# Altium footprint library Molex FFC - FPC Connectors (SMT).PcbLib: 638 footprints (part 4 of 40)
Each footprint in its own frame and in the unit in brackets; x right, y up, seen from the top. Pads: shape width x height; smd on the part's side, far side on the other; paste and mask are expansions set on the pad; w line width, h text height; cw(c..) or ccw(c..) is an arc to the next point about the centre after c.
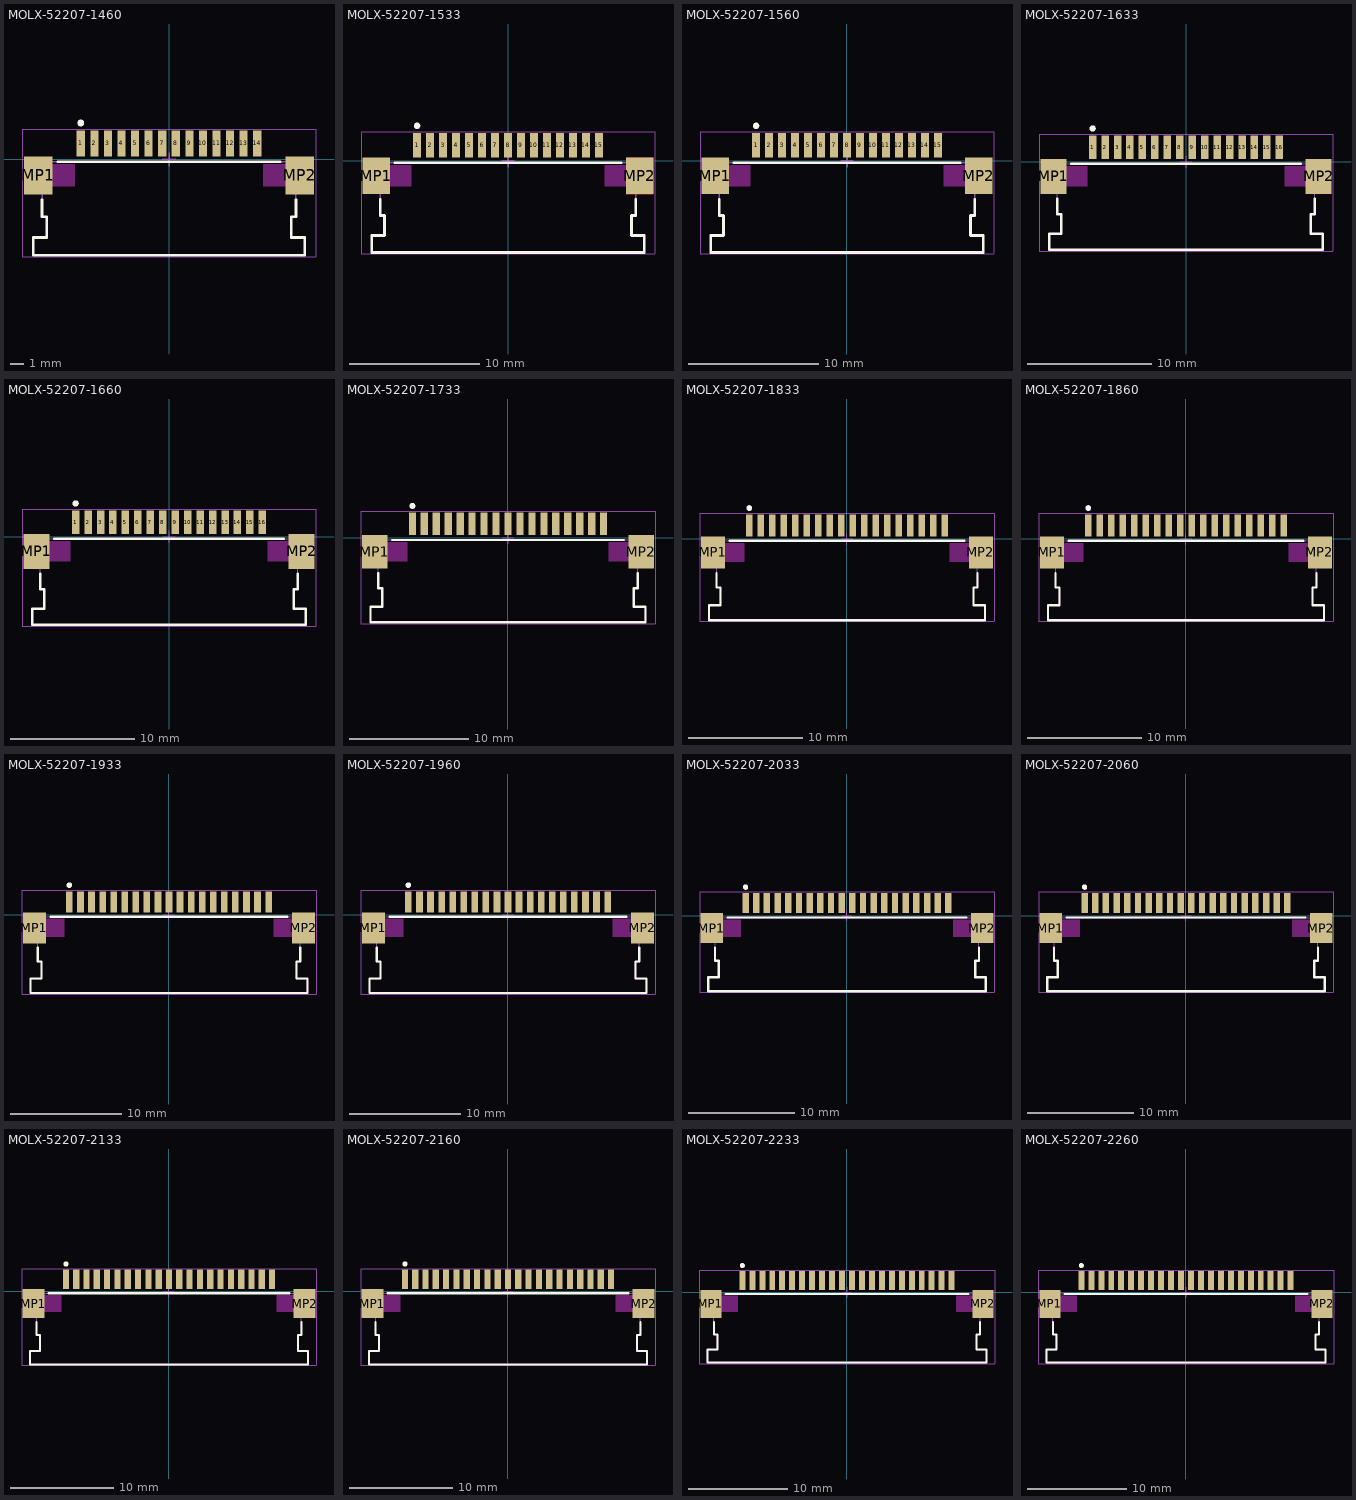
[diagram p3: the footprints below, top view; thin cyan lines are the x and y axes]

## MOLX-52207-1460 [mm] "FPC Connector, 14-Leads, Right Angle, Pitch 1.0 mm, Mated Height 2.7 mm, SMT"
height 2.712
pads (16):
  rect 0.6x1.9 smd: 1(-6.5,1.175) 2(-5.5,1.175) 3(-4.5,1.175) 4(-3.5,1.175) 5(-2.5,1.175) 6(-1.5,1.175) 7(-0.5,1.175) 8(0.5,1.175) 9(1.5,1.175) 10(2.5,1.175) 11(3.5,1.175) 12(4.5,1.175) 13(5.5,1.175) 14(6.5,1.175)
  rect 2.1x2.8 smd: MP1(-9.65,-1.175) MP2(9.65,-1.175)
Top Overlay:
  circle w0.25: c-6.5,2.675 r0.125
  lines w0.2: -9.35,-2.975 -9.35,-4.225 -9.013,-4.225 ; -9.012,-4.225 -9.012,-5.765 -10,-5.765 -10,-7.075 10,-7.075 10,-5.765 9.012,-5.765 9.012,-4.225 ; -8.2,-0.175 8.2,-0.175 ; 9.013,-4.225 9.35,-4.225 9.35,-2.975
Keep-Out Layer:
  region: -8.6,-0.375 -6.95,-0.375 -6.95,-1.975 -8.6,-1.975
  region: 8.6,-0.375 6.95,-0.375 6.95,-1.975 8.6,-1.975
Mechanical 13:
  lines w0.1: -10.15,-2.175 -10.15,-0.175 10.15,-0.175 10.15,-2.175 9.35,-2.175 9.35,-4.225 9.012,-4.225 9.012,-5.765 10,-5.765 10,-7.075 -10,-7.075 -10,-5.765 -9.012,-5.765 -9.012,-4.225 -9.35,-4.225 -9.35,-2.175 -10.15,-2.175
Mechanical 15:
  lines w0.05: -10.8,-7.175 -10.8,2.225 10.8,2.225 10.8,-7.175 -10.8,-7.175
  lines w0.1: -0.5,0 0.5,0 ; 0,-0.5 0,0.5
3D body: height 0.25, standoff 0, extent -10.15,-7.075 10.15,1.825

## MOLX-52207-1533 [mm] "FPC Connector, 15-Leads, Right Angle, Pitch 1.0 mm, Mated Height 2.7 mm, SMT"
height 2.712
pads (17):
  rect 0.6x1.9 smd: 1(-7,1.175) 2(-6,1.175) 3(-5,1.175) 4(-4,1.175) 5(-3,1.175) 6(-2,1.175) 7(-1,1.175) 8(0,1.175) 9(1,1.175) 10(2,1.175) 11(3,1.175) 12(4,1.175) 13(5,1.175) 14(6,1.175) 15(7,1.175)
  rect 2.1x2.8 smd: MP1(-10.15,-1.175) MP2(10.15,-1.175)
Top Layer:
  region: 11.2,0.225 9.1,0.225 9.1,-2.575 11.2,-2.575
Top Overlay:
  circle w0.25: c-7,2.675 r0.125
  lines w0.2: -9.85,-2.975 -9.85,-4.225 -9.513,-4.225 -9.512,-5.765 -10.5,-5.765 -10.5,-7.075 10.5,-7.075 10.5,-5.765 9.512,-5.765 9.512,-4.225 9.85,-4.225 9.85,-2.975 ; -8.7,-0.175 8.7,-0.175
Keep-Out Layer:
  region: 9.1,-0.375 7.45,-0.375 7.45,-1.975 9.1,-1.975
  region: -9.1,-0.375 -7.45,-0.375 -7.45,-1.975 -9.1,-1.975
Mechanical 13:
  lines w0.1: -10.65,-2.175 -9.85,-2.175 -9.85,-4.225 -9.512,-4.225 -9.512,-5.765 -10.5,-5.765 -10.5,-7.075 10.5,-7.075 10.5,-5.765 9.512,-5.765 9.512,-4.225 9.85,-4.225 9.85,-2.175 10.65,-2.175 10.65,-0.175 -10.65,-0.175 -10.65,-2.175
Mechanical 15:
  lines w0.05: -11.3,-7.175 11.3,-7.175 11.3,2.225 -11.3,2.225 -11.3,-7.175
  lines w0.1: -0.5,0 0.5,0 ; 0,-0.5 0,0.5
3D body: height 0.25, standoff 0, extent -10.65,-7.075 10.65,1.825

## MOLX-52207-1560 [mm] "FPC Connector, 15-Leads, Right Angle, Pitch 1.0 mm, Mated Height 2.7 mm, SMT"
height 2.712
pads (17):
  rect 0.6x1.9 smd: 1(-7,1.175) 2(-6,1.175) 3(-5,1.175) 4(-4,1.175) 5(-3,1.175) 6(-2,1.175) 7(-1,1.175) 8(0,1.175) 9(1,1.175) 10(2,1.175) 11(3,1.175) 12(4,1.175) 13(5,1.175) 14(6,1.175) 15(7,1.175)
  rect 2.1x2.8 smd: MP1(-10.15,-1.175) MP2(10.15,-1.175)
Top Overlay:
  circle w0.25: c-7,2.675 r0.125
  lines w0.2: -9.85,-2.975 -9.85,-4.225 -9.513,-4.225 -9.512,-5.765 -10.5,-5.765 -10.5,-7.075 10.5,-7.075 10.5,-5.765 9.512,-5.765 9.512,-4.225 9.85,-4.225 9.85,-2.975 ; -8.7,-0.175 8.7,-0.175
Keep-Out Layer:
  region: -9.1,-0.375 -7.45,-0.375 -7.45,-1.975 -9.1,-1.975
  region: 9.1,-0.375 7.45,-0.375 7.45,-1.975 9.1,-1.975
Mechanical 13:
  lines w0.1: -10.65,-2.175 -10.65,-0.175 10.65,-0.175 10.65,-2.175 9.85,-2.175 9.85,-4.225 9.512,-4.225 9.512,-5.765 10.5,-5.765 10.5,-7.075 -10.5,-7.075 -10.5,-5.765 -9.512,-5.765 -9.512,-4.225 -9.85,-4.225 -9.85,-2.175 -10.65,-2.175
Mechanical 15:
  lines w0.05: -11.3,-7.175 -11.3,2.225 11.3,2.225 11.3,-7.175 -11.3,-7.175
  lines w0.1: -0.5,0 0.5,0 ; 0,-0.5 0,0.5
3D body: height 0.25, standoff 0, extent -10.65,-7.075 10.65,1.825

## MOLX-52207-1633 [mm] "FPC Connector, 16-Leads, Right Angle, Pitch 1.0 mm, Mated Height 2.7 mm, SMT"
height 2.712
pads (18):
  rect 0.6x1.9 smd: 1(-7.5,1.175) 2(-6.5,1.175) 3(-5.5,1.175) 4(-4.5,1.175) 5(-3.5,1.175) 6(-2.5,1.175) 7(-1.5,1.175) 8(-0.5,1.175) 9(0.5,1.175) 10(1.5,1.175) 11(2.5,1.175) 12(3.5,1.175) 13(4.5,1.175) 14(5.5,1.175) 15(6.5,1.175) 16(7.5,1.175)
  rect 2.1x2.8 smd: MP1(-10.65,-1.175) MP2(10.65,-1.175)
Top Overlay:
  circle w0.25: c-7.5,2.675 r0.125
  lines w0.2: -10.35,-2.975 -10.35,-4.225 -10.013,-4.225 -10.012,-5.765 -11,-5.765 -11,-7.075 11,-7.075 11,-5.765 10.012,-5.765 10.012,-4.225 10.35,-4.225 10.35,-2.975 ; -9.2,-0.175 9.2,-0.175
Keep-Out Layer:
  region: -9.6,-0.375 -7.95,-0.375 -7.95,-1.975 -9.6,-1.975
  region: 9.6,-0.375 7.95,-0.375 7.95,-1.975 9.6,-1.975
Mechanical 13:
  lines w0.1: -11.15,-2.175 -11.15,-0.175 11.15,-0.175 11.15,-2.175 10.35,-2.175 10.35,-4.225 10.012,-4.225 10.012,-5.765 11,-5.765 11,-7.075 -11,-7.075 -11,-5.765 -10.012,-5.765 -10.012,-4.225 -10.35,-4.225 -10.35,-2.175 -11.15,-2.175
Mechanical 15:
  lines w0.05: -11.8,-7.175 -11.8,2.225 11.8,2.225 11.8,-7.175 -11.8,-7.175
  lines w0.1: -0.5,0 0.5,0 ; 0,-0.5 0,0.5
3D body: height 0.25, standoff 0, extent -11.15,-7.075 11.15,1.825

## MOLX-52207-1660 [mm] "FPC Connector, 16-Leads, Right Angle, Pitch 1.0 mm, Mated Height 2.7 mm, SMT"
height 2.712
pads (18):
  rect 0.6x1.9 smd: 1(-7.5,1.175) 2(-6.5,1.175) 3(-5.5,1.175) 4(-4.5,1.175) 5(-3.5,1.175) 6(-2.5,1.175) 7(-1.5,1.175) 8(-0.5,1.175) 9(0.5,1.175) 10(1.5,1.175) 11(2.5,1.175) 12(3.5,1.175) 13(4.5,1.175) 14(5.5,1.175) 15(6.5,1.175) 16(7.5,1.175)
  rect 2.1x2.8 smd: MP1(-10.65,-1.175) MP2(10.65,-1.175)
Top Overlay:
  circle w0.25: c-7.5,2.675 r0.125
  lines w0.2: -10.35,-2.975 -10.35,-4.225 -10.013,-4.225 -10.012,-5.765 -11,-5.765 -11,-7.075 11,-7.075 11,-5.765 10.012,-5.765 10.012,-4.225 10.35,-4.225 10.35,-2.975 ; -9.2,-0.175 9.2,-0.175
Keep-Out Layer:
  region: -9.6,-0.375 -7.95,-0.375 -7.95,-1.975 -9.6,-1.975
  region: 9.6,-0.375 7.95,-0.375 7.95,-1.975 9.6,-1.975
Mechanical 13:
  lines w0.1: -11.15,-2.175 -11.15,-0.175 11.15,-0.175 11.15,-2.175 10.35,-2.175 10.35,-4.225 10.012,-4.225 10.012,-5.765 11,-5.765 11,-7.075 -11,-7.075 -11,-5.765 -10.012,-5.765 -10.012,-4.225 -10.35,-4.225 -10.35,-2.175 -11.15,-2.175
Mechanical 15:
  lines w0.05: -11.8,-7.175 -11.8,2.225 11.8,2.225 11.8,-7.175 -11.8,-7.175
  lines w0.1: -0.5,0 0.5,0 ; 0,-0.5 0,0.5
3D body: height 0.25, standoff 0, extent -11.15,-7.075 11.15,1.825

## MOLX-52207-1733 [mm] "FPC Connector, 17-Leads, Right Angle, Pitch 1.0 mm, Mated Height 2.7 mm, SMT"
height 2.712
pads (19):
  rect 0.6x1.9 smd: 1(-8,1.175) 2(-7,1.175) 3(-6,1.175) 4(-5,1.175) 5(-4,1.175) 6(-3,1.175) 7(-2,1.175) 8(-1,1.175) 9(0,1.175) 10(1,1.175) 11(2,1.175) 12(3,1.175) 13(4,1.175) 14(5,1.175) 15(6,1.175) 16(7,1.175) 17(8,1.175)
  rect 2.1x2.8 smd: MP1(-11.15,-1.175) MP2(11.15,-1.175)
Top Overlay:
  circle w0.25: c-8,2.675 r0.125
  lines w0.2: -10.85,-2.975 -10.85,-4.225 -10.513,-4.225 ; -10.512,-4.225 -10.512,-5.765 -11.5,-5.765 -11.5,-7.075 11.5,-7.075 11.5,-5.765 10.512,-5.765 10.512,-4.225 10.85,-4.225 10.85,-2.975 ; -9.7,-0.175 9.7,-0.175
Keep-Out Layer:
  region: 10.1,-0.375 8.45,-0.375 8.45,-1.975 10.1,-1.975
  region: -10.1,-0.375 -8.45,-0.375 -8.45,-1.975 -10.1,-1.975
Mechanical 13:
  lines w0.1: -10.512,-4.225 -10.85,-4.225 -10.85,-2.175 -11.65,-2.175 -11.65,-0.175 11.65,-0.175 11.65,-2.175 10.85,-2.175 10.85,-4.225 10.512,-4.225 10.512,-5.765 11.5,-5.765 11.5,-7.075 -11.5,-7.075 -11.5,-5.765 -10.512,-5.765 -10.512,-4.225
Mechanical 15:
  lines w0.05: -12.3,-7.175 12.3,-7.175 12.3,2.225 -12.3,2.225 -12.3,-7.175
  lines w0.1: -0.5,0 0.5,0 ; 0,-0.5 0,0.5
3D body: height 0.25, standoff 0, extent -11.65,-7.075 11.65,1.825

## MOLX-52207-1833 [mm] "FPC Connector, 18-Leads, Right Angle, Pitch 1.0 mm, Mated Height 2.7 mm, SMT"
height 2.712
pads (20):
  rect 0.6x1.9 smd: 1(-8.5,1.175) 2(-7.5,1.175) 3(-6.5,1.175) 4(-5.5,1.175) 5(-4.5,1.175) 6(-3.5,1.175) 7(-2.5,1.175) 8(-1.5,1.175) 9(-0.5,1.175) 10(0.5,1.175) 11(1.5,1.175) 12(2.5,1.175) 13(3.5,1.175) 14(4.5,1.175) 15(5.5,1.175) 16(6.5,1.175) 17(7.5,1.175) 18(8.5,1.175)
  rect 2.1x2.8 smd: MP1(-11.65,-1.175) MP2(11.65,-1.175)
Top Overlay:
  circle w0.25: c-8.5,2.675 r0.125
  lines w0.2: -11.35,-2.975 -11.35,-4.225 -11.013,-4.225 -11.012,-5.765 -12,-5.765 -12,-7.075 12,-7.075 12,-5.765 11.012,-5.765 11.012,-4.225 11.35,-4.225 11.35,-2.975 ; -10.2,-0.175 10.2,-0.175
Keep-Out Layer:
  region: -10.6,-0.375 -8.95,-0.375 -8.95,-1.975 -10.6,-1.975
  region: 10.6,-0.375 8.95,-0.375 8.95,-1.975 10.6,-1.975
Mechanical 13:
  lines w0.1: -12.15,-2.175 -12.15,-0.175 12.15,-0.175 12.15,-2.175 11.35,-2.175 11.35,-4.225 11.012,-4.225 11.012,-5.765 12,-5.765 12,-7.075 -12,-7.075 -12,-5.765 -11.012,-5.765 -11.012,-4.225 -11.35,-4.225 -11.35,-2.175 -12.15,-2.175
Mechanical 15:
  lines w0.05: -12.8,-7.175 -12.8,2.225 12.8,2.225 12.8,-7.175 -12.8,-7.175
  lines w0.1: -0.5,0 0.5,0 ; 0,-0.5 0,0.5
3D body: height 0.25, standoff 0, extent -12.15,-7.075 12.15,1.825

## MOLX-52207-1860 [mm] "FPC Connector, 18-Leads, Right Angle, Pitch 1.0 mm, Mated Height 2.7 mm, SMT"
height 2.712
pads (20):
  rect 0.6x1.9 smd: 1(-8.5,1.175) 2(-7.5,1.175) 3(-6.5,1.175) 4(-5.5,1.175) 5(-4.5,1.175) 6(-3.5,1.175) 7(-2.5,1.175) 8(-1.5,1.175) 9(-0.5,1.175) 10(0.5,1.175) 11(1.5,1.175) 12(2.5,1.175) 13(3.5,1.175) 14(4.5,1.175) 15(5.5,1.175) 16(6.5,1.175) 17(7.5,1.175) 18(8.5,1.175)
  rect 2.1x2.8 smd: MP1(-11.65,-1.175) MP2(11.65,-1.175)
Top Overlay:
  circle w0.25: c-8.5,2.675 r0.125
  lines w0.2: -11.35,-2.975 -11.35,-4.225 -11.013,-4.225 -11.012,-5.765 -12,-5.765 -12,-7.075 12,-7.075 12,-5.765 11.012,-5.765 11.012,-4.225 11.35,-4.225 11.35,-2.975 ; -10.2,-0.175 10.2,-0.175
Keep-Out Layer:
  region: -10.6,-0.375 -8.95,-0.375 -8.95,-1.975 -10.6,-1.975
  region: 10.6,-0.375 8.95,-0.375 8.95,-1.975 10.6,-1.975
Mechanical 13:
  lines w0.1: -12.15,-2.175 -12.15,-0.175 12.15,-0.175 12.15,-2.175 11.35,-2.175 11.35,-4.225 11.012,-4.225 11.012,-5.765 12,-5.765 12,-7.075 -12,-7.075 -12,-5.765 -11.012,-5.765 -11.012,-4.225 -11.35,-4.225 -11.35,-2.175 -12.15,-2.175
Mechanical 15:
  lines w0.05: -12.8,-7.175 -12.8,2.225 12.8,2.225 12.8,-7.175 -12.8,-7.175
  lines w0.1: -0.5,0 0.5,0 ; 0,-0.5 0,0.5
3D body: height 0.25, standoff 0, extent -12.15,-7.075 12.15,1.825

## MOLX-52207-1933 [mm] "FPC Connector, 19-Leads, Right Angle, Pitch 1.0 mm, Mated Height 2.7 mm, SMT"
height 2.712
pads (21):
  rect 0.6x1.9 smd: 1(-9,1.175) 2(-8,1.175) 3(-7,1.175) 4(-6,1.175) 5(-5,1.175) 6(-4,1.175) 7(-3,1.175) 8(-2,1.175) 9(-1,1.175) 10(0,1.175) 11(1,1.175) 12(2,1.175) 13(3,1.175) 14(4,1.175) 15(5,1.175) 16(6,1.175) 17(7,1.175) 18(8,1.175) 19(9,1.175)
  rect 2.1x2.8 smd: MP1(-12.15,-1.175) MP2(12.15,-1.175)
Top Overlay:
  circle w0.25: c-9,2.675 r0.125
  lines w0.2: -11.85,-2.975 -11.85,-4.225 -11.513,-4.225 -11.512,-5.765 -12.5,-5.765 -12.5,-7.075 12.5,-7.075 12.5,-5.765 11.512,-5.765 11.512,-4.225 11.85,-4.225 11.85,-2.975 ; -10.7,-0.175 10.7,-0.175
Keep-Out Layer:
  region: -11.1,-0.375 -9.45,-0.375 -9.45,-1.975 -11.1,-1.975
  region: 11.1,-0.375 9.45,-0.375 9.45,-1.975 11.1,-1.975
Mechanical 13:
  lines w0.1: -12.5,-5.765 -11.512,-5.765 -11.512,-4.225 -11.85,-4.225 -11.85,-2.175 -12.65,-2.175 -12.65,-0.175 12.65,-0.175 12.65,-2.175 11.85,-2.175 11.85,-4.225 11.512,-4.225 11.512,-5.765 12.5,-5.765 ; -12.5,-5.765 -12.5,-7.075 12.5,-7.075 12.5,-5.765
Mechanical 15:
  lines w0.05: -13.3,-7.175 -13.3,2.225 13.3,2.225 13.3,-7.175 -13.3,-7.175
  lines w0.1: -0.5,0 0.5,0 ; 0,-0.5 0,0.5
3D body: height 0.25, standoff 0, extent -12.65,-7.075 12.65,1.825

## MOLX-52207-1960 [mm] "FPC Connector, 19-Leads, Right Angle, Pitch 1.0 mm, Mated Height 2.7 mm, SMT"
height 2.712
pads (21):
  rect 0.6x1.9 smd: 1(-9,1.175) 2(-8,1.175) 3(-7,1.175) 4(-6,1.175) 5(-5,1.175) 6(-4,1.175) 7(-3,1.175) 8(-2,1.175) 9(-1,1.175) 10(0,1.175) 11(1,1.175) 12(2,1.175) 13(3,1.175) 14(4,1.175) 15(5,1.175) 16(6,1.175) 17(7,1.175) 18(8,1.175) 19(9,1.175)
  rect 2.1x2.8 smd: MP1(-12.15,-1.175) MP2(12.15,-1.175)
Top Overlay:
  circle w0.25: c-9,2.675 r0.125
  lines w0.2: -11.85,-2.975 -11.85,-4.225 -11.513,-4.225 -11.512,-5.765 -12.5,-5.765 -12.5,-7.075 12.5,-7.075 12.5,-5.765 11.512,-5.765 11.512,-4.225 11.85,-4.225 11.85,-2.975 ; -10.7,-0.175 10.7,-0.175
Keep-Out Layer:
  region: -11.1,-0.375 -9.45,-0.375 -9.45,-1.975 -11.1,-1.975
  region: 11.1,-0.375 9.45,-0.375 9.45,-1.975 11.1,-1.975
Mechanical 13:
  lines w0.1: -12.5,-5.765 -11.512,-5.765 -11.512,-4.225 -11.85,-4.225 -11.85,-2.175 -12.65,-2.175 -12.65,-0.175 12.65,-0.175 12.65,-2.175 11.85,-2.175 11.85,-4.225 11.512,-4.225 11.512,-5.765 12.5,-5.765 ; -12.5,-5.765 -12.5,-7.075 12.5,-7.075 12.5,-5.765
Mechanical 15:
  lines w0.05: -13.3,-7.175 -13.3,2.225 13.3,2.225 13.3,-7.175 -13.3,-7.175
  lines w0.1: -0.5,0 0.5,0 ; 0,-0.5 0,0.5
3D body: height 0.25, standoff 0, extent -12.65,-7.075 12.65,1.825

## MOLX-52207-2033 [mm] "FPC Connector, 20-Leads, Right Angle, Pitch 1.0 mm, Mated Height 2.7 mm, SMT"
height 2.712
pads (22):
  rect 0.6x1.9 smd: 1(-9.5,1.175) 2(-8.5,1.175) 3(-7.5,1.175) 4(-6.5,1.175) 5(-5.5,1.175) 6(-4.5,1.175) 7(-3.5,1.175) 8(-2.5,1.175) 9(-1.5,1.175) 10(-0.5,1.175) 11(0.5,1.175) 12(1.5,1.175) 13(2.5,1.175) 14(3.5,1.175) 15(4.5,1.175) 16(5.5,1.175) 17(6.5,1.175) 18(7.5,1.175) 19(8.5,1.175) 20(9.5,1.175)
  rect 2.1x2.8 smd: MP1(-12.65,-1.175) MP2(12.65,-1.175)
Top Overlay:
  circle w0.25: c-9.5,2.675 r0.125
  lines w0.2: -12.35,-2.975 -12.35,-4.225 -12.013,-4.225 -12.012,-5.765 -13,-5.765 -13,-7.075 13,-7.075 13,-5.765 12.012,-5.765 12.012,-4.225 12.35,-4.225 12.35,-2.975 ; -11.2,-0.175 11.2,-0.175
Keep-Out Layer:
  region: 11.6,-0.375 9.95,-0.375 9.95,-1.975 11.6,-1.975
  region: -11.6,-0.375 -9.95,-0.375 -9.95,-1.975 -11.6,-1.975
Mechanical 13:
  lines w0.1: -13.15,-2.175 -12.35,-2.175 -12.35,-4.225 -12.012,-4.225 -12.012,-5.765 -13,-5.765 -13,-7.075 13,-7.075 13,-5.765 12.012,-5.765 12.012,-4.225 12.35,-4.225 12.35,-2.175 13.15,-2.175 13.15,-0.175 -13.15,-0.175 -13.15,-2.175
Mechanical 15:
  lines w0.05: -13.8,-7.175 13.8,-7.175 13.8,2.225 -13.8,2.225 -13.8,-7.175
  lines w0.1: -0.5,0 0.5,0 ; 0,-0.5 0,0.5
3D body: height 0.25, standoff 0, extent -13.15,-7.075 13.15,1.825

## MOLX-52207-2060 [mm] "FPC Connector, 20-Leads, Right Angle, Pitch 1.0 mm, Mated Height 2.7 mm, SMT"
height 2.712
pads (22):
  rect 0.6x1.9 smd: 1(-9.5,1.175) 2(-8.5,1.175) 3(-7.5,1.175) 4(-6.5,1.175) 5(-5.5,1.175) 6(-4.5,1.175) 7(-3.5,1.175) 8(-2.5,1.175) 9(-1.5,1.175) 10(-0.5,1.175) 11(0.5,1.175) 12(1.5,1.175) 13(2.5,1.175) 14(3.5,1.175) 15(4.5,1.175) 16(5.5,1.175) 17(6.5,1.175) 18(7.5,1.175) 19(8.5,1.175) 20(9.5,1.175)
  rect 2.1x2.8 smd: MP1(-12.65,-1.175) MP2(12.65,-1.175)
Top Overlay:
  circle w0.25: c-9.5,2.675 r0.125
  lines w0.2: -12.35,-2.975 -12.35,-4.225 -12.013,-4.225 -12.012,-5.765 -13,-5.765 -13,-7.075 13,-7.075 13,-5.765 12.012,-5.765 12.012,-4.225 12.35,-4.225 12.35,-2.975 ; -11.2,-0.175 11.2,-0.175
Keep-Out Layer:
  region: -11.6,-0.375 -9.95,-0.375 -9.95,-1.975 -11.6,-1.975
  region: 11.6,-0.375 9.95,-0.375 9.95,-1.975 11.6,-1.975
Mechanical 13:
  lines w0.1: -13.15,-2.175 -13.15,-0.175 13.15,-0.175 13.15,-2.175 12.35,-2.175 12.35,-4.225 12.012,-4.225 12.012,-5.765 13,-5.765 13,-7.075 -13,-7.075 -13,-5.765 -12.012,-5.765 -12.012,-4.225 -12.35,-4.225 -12.35,-2.175 -13.15,-2.175
Mechanical 15:
  lines w0.05: -13.8,-7.175 -13.8,2.225 13.8,2.225 13.8,-7.175 -13.8,-7.175
  lines w0.1: -0.5,0 0.5,0 ; 0,-0.5 0,0.5
3D body: height 0.25, standoff 0, extent -13.15,-7.075 13.15,1.825

## MOLX-52207-2133 [mm] "FPC Connector, 21-Leads, Right Angle, Pitch 1.0 mm, Mated Height 2.7 mm, SMT"
height 2.712
pads (23):
  rect 0.6x1.9 smd: 1(-10,1.175) 2(-9,1.175) 3(-8,1.175) 4(-7,1.175) 5(-6,1.175) 6(-5,1.175) 7(-4,1.175) 8(-3,1.175) 9(-2,1.175) 10(-1,1.175) 11(0,1.175) 12(1,1.175) 13(2,1.175) 14(3,1.175) 15(4,1.175) 16(5,1.175) 17(6,1.175) 18(7,1.175) 19(8,1.175) 20(9,1.175) 21(10,1.175)
  rect 2.1x2.8 smd: MP1(-13.15,-1.175) MP2(13.15,-1.175)
Top Overlay:
  circle w0.25: c-10,2.675 r0.125
  lines w0.2: -12.85,-2.975 -12.85,-4.225 -12.513,-4.225 -12.512,-5.765 -13.5,-5.765 -13.5,-7.075 13.5,-7.075 13.5,-5.765 12.512,-5.765 12.512,-4.225 12.85,-4.225 12.85,-2.975 ; -11.7,-0.175 11.7,-0.175
Keep-Out Layer:
  region: -12.1,-0.375 -10.45,-0.375 -10.45,-1.975 -12.1,-1.975
  region: 12.1,-0.375 10.45,-0.375 10.45,-1.975 12.1,-1.975
Mechanical 13:
  lines w0.1: -13.65,-2.175 -13.65,-0.175 13.65,-0.175 13.65,-2.175 12.85,-2.175 12.85,-4.225 12.512,-4.225 12.512,-5.765 13.5,-5.765 13.5,-7.075 -13.5,-7.075 -13.5,-5.765 -12.512,-5.765 -12.512,-4.225 -12.85,-4.225 -12.85,-2.175 -13.65,-2.175
Mechanical 15:
  lines w0.05: -14.3,-7.175 -14.3,2.225 14.3,2.225 14.3,-7.175 -14.3,-7.175
  lines w0.1: -0.5,0 0.5,0 ; 0,-0.5 0,0.5
3D body: height 0.25, standoff 0, extent -13.65,-7.075 13.65,1.825

## MOLX-52207-2160 [mm] "FPC Connector, 21-Leads, Right Angle, Pitch 1.0 mm, Mated Height 2.7 mm, SMT"
height 2.712
pads (23):
  rect 0.6x1.9 smd: 1(-10,1.175) 2(-9,1.175) 3(-8,1.175) 4(-7,1.175) 5(-6,1.175) 6(-5,1.175) 7(-4,1.175) 8(-3,1.175) 9(-2,1.175) 10(-1,1.175) 11(0,1.175) 12(1,1.175) 13(2,1.175) 14(3,1.175) 15(4,1.175) 16(5,1.175) 17(6,1.175) 18(7,1.175) 19(8,1.175) 20(9,1.175) 21(10,1.175)
  rect 2.1x2.8 smd: MP1(-13.15,-1.175) MP2(13.15,-1.175)
Top Overlay:
  circle w0.25: c-10,2.675 r0.125
  lines w0.2: -12.85,-2.975 -12.85,-4.225 -12.513,-4.225 -12.512,-5.765 -13.5,-5.765 -13.5,-7.075 13.5,-7.075 13.5,-5.765 12.512,-5.765 12.512,-4.225 12.85,-4.225 12.85,-2.975 ; -11.7,-0.175 11.7,-0.175
Keep-Out Layer:
  region: 12.1,-0.375 10.45,-0.375 10.45,-1.975 12.1,-1.975
  region: -12.1,-0.375 -10.45,-0.375 -10.45,-1.975 -12.1,-1.975
Mechanical 13:
  lines w0.1: -13.65,-2.175 -12.85,-2.175 -12.85,-4.225 -12.512,-4.225 -12.512,-5.765 -13.5,-5.765 -13.5,-7.075 13.5,-7.075 13.5,-5.765 12.512,-5.765 12.512,-4.225 12.85,-4.225 12.85,-2.175 13.65,-2.175 13.65,-0.175 -13.65,-0.175 -13.65,-2.175
Mechanical 15:
  lines w0.05: -14.3,-7.175 14.3,-7.175 14.3,2.225 -14.3,2.225 -14.3,-7.175
  lines w0.1: -0.5,0 0.5,0 ; 0,-0.5 0,0.5
3D body: height 0.25, standoff 0, extent -13.65,-7.075 13.65,1.825

## MOLX-52207-2233 [mm] "FPC Connector, 22-Leads, Right Angle, Pitch 1.0 mm, Mated Height 2.7 mm, SMT"
height 2.712
pads (24):
  rect 0.6x1.9 smd: 1(-10.5,1.175) 2(-9.5,1.175) 3(-8.5,1.175) 4(-7.5,1.175) 5(-6.5,1.175) 6(-5.5,1.175) 7(-4.5,1.175) 8(-3.5,1.175) 9(-2.5,1.175) 10(-1.5,1.175) 11(-0.5,1.175) 12(0.5,1.175) 13(1.5,1.175) 14(2.5,1.175) 15(3.5,1.175) 16(4.5,1.175) 17(5.5,1.175) 18(6.5,1.175) 19(7.5,1.175) 20(8.5,1.175) 21(9.5,1.175) 22(10.5,1.175)
  rect 2.1x2.8 smd: MP1(-13.65,-1.175) MP2(13.65,-1.175)
Top Overlay:
  circle w0.25: c-10.5,2.675 r0.125
  lines w0.2: -13.35,-2.975 -13.35,-4.225 -13.013,-4.225 -13.012,-5.765 -14,-5.765 -14,-7.075 14,-7.075 14,-5.765 13.012,-5.765 13.012,-4.225 13.35,-4.225 13.35,-2.975 ; -12.2,-0.175 12.2,-0.175
Keep-Out Layer:
  region: -12.6,-0.375 -10.95,-0.375 -10.95,-1.975 -12.6,-1.975
  region: 12.6,-0.375 10.95,-0.375 10.95,-1.975 12.6,-1.975
Mechanical 13:
  lines w0.1: -14.15,-2.175 -14.15,-0.175 14.15,-0.175 14.15,-2.175 13.35,-2.175 13.35,-4.225 13.012,-4.225 13.012,-5.765 14,-5.765 14,-7.075 -14,-7.075 -14,-5.765 -13.012,-5.765 -13.012,-4.225 -13.35,-4.225 -13.35,-2.175 -14.15,-2.175
Mechanical 15:
  lines w0.05: -14.8,-7.175 -14.8,2.225 14.8,2.225 14.8,-7.175 -14.8,-7.175
  lines w0.1: -0.5,0 0.5,0 ; 0,-0.5 0,0.5
3D body: height 0.25, standoff 0, extent -14.15,-7.075 14.15,1.825

## MOLX-52207-2260 [mm] "FPC Connector, 22-Leads, Right Angle, Pitch 1.0 mm, Mated Height 2.7 mm, SMT"
height 2.712
pads (24):
  rect 0.6x1.9 smd: 1(-10.5,1.175) 2(-9.5,1.175) 3(-8.5,1.175) 4(-7.5,1.175) 5(-6.5,1.175) 6(-5.5,1.175) 7(-4.5,1.175) 8(-3.5,1.175) 9(-2.5,1.175) 10(-1.5,1.175) 11(-0.5,1.175) 12(0.5,1.175) 13(1.5,1.175) 14(2.5,1.175) 15(3.5,1.175) 16(4.5,1.175) 17(5.5,1.175) 18(6.5,1.175) 19(7.5,1.175) 20(8.5,1.175) 21(9.5,1.175) 22(10.5,1.175)
  rect 2.1x2.8 smd: MP1(-13.65,-1.175) MP2(13.65,-1.175)
Top Overlay:
  circle w0.25: c-10.5,2.675 r0.125
  lines w0.2: -13.35,-2.975 -13.35,-4.225 -13.013,-4.225 -13.012,-5.765 -14,-5.765 -14,-7.075 14,-7.075 14,-5.765 13.012,-5.765 13.012,-4.225 13.35,-4.225 13.35,-2.975 ; -12.2,-0.175 12.2,-0.175
Keep-Out Layer:
  region: -12.6,-0.375 -10.95,-0.375 -10.95,-1.975 -12.6,-1.975
  region: 12.6,-0.375 10.95,-0.375 10.95,-1.975 12.6,-1.975
Mechanical 13:
  lines w0.1: -14.15,-2.175 -14.15,-0.175 14.15,-0.175 14.15,-2.175 13.35,-2.175 13.35,-4.225 13.012,-4.225 13.012,-5.765 14,-5.765 14,-7.075 -14,-7.075 -14,-5.765 -13.012,-5.765 -13.012,-4.225 -13.35,-4.225 -13.35,-2.175 -14.15,-2.175
Mechanical 15:
  lines w0.05: -14.8,-7.175 -14.8,2.225 14.8,2.225 14.8,-7.175 -14.8,-7.175
  lines w0.1: -0.5,0 0.5,0 ; 0,-0.5 0,0.5
3D body: height 0.25, standoff 0, extent -14.15,-7.075 14.15,1.825